# Altium footprint library Footprints.PcbLib: 135 footprints (part 5 of 9)
Each footprint in its own frame and in the unit in brackets; x right, y up, seen from the top. Pads: shape width x height; smd on the part's side, far side on the other; paste and mask are expansions set on the pad; w line width, h text height; cw(c..) or ccw(c..) is an arc to the next point about the centre after c.
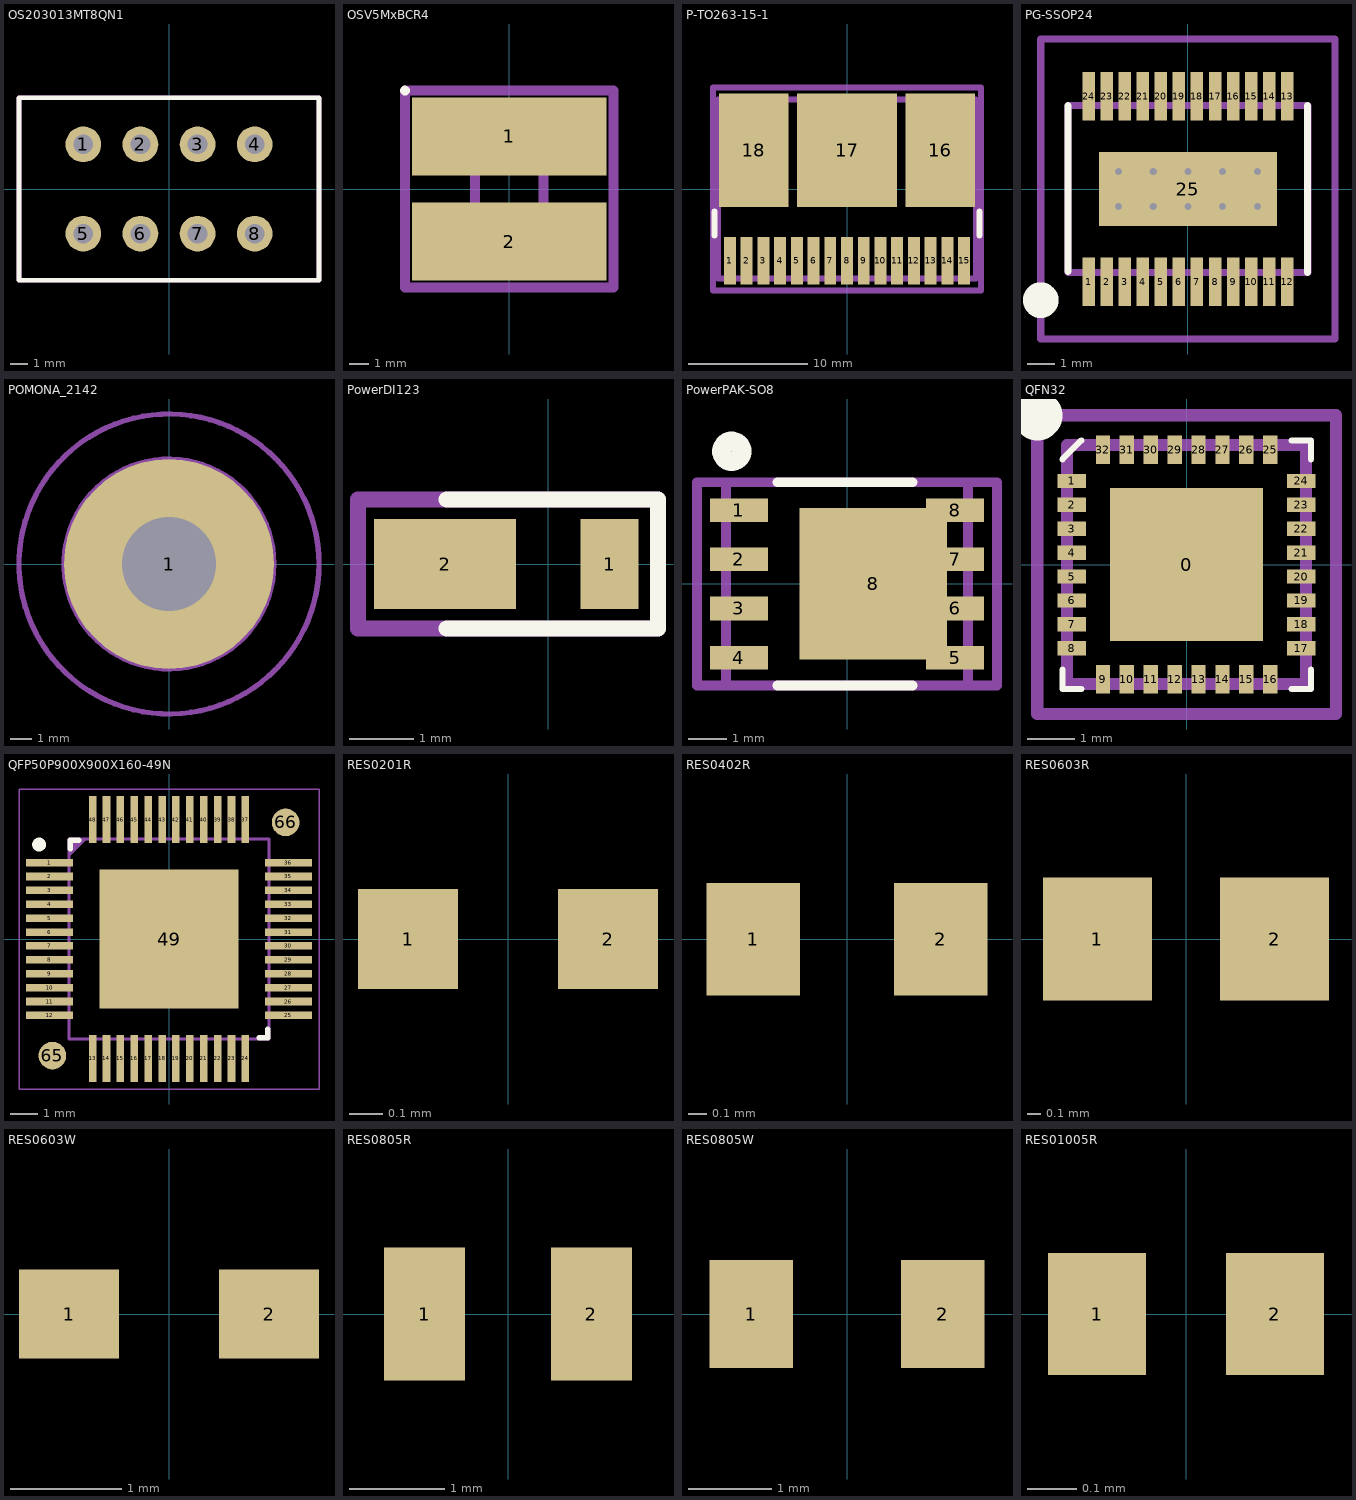
[diagram p4: the footprints below, top view; thin cyan lines are the x and y axes]

## OS203013MT8QN1 [mm] "DP3T Slide Switch"
height 2.88
pads (8):
  round 2 hole 1.1 mask+0.102: 1(-4.8,2.5) 2(-1.6,2.5) 3(1.6,2.5) 4(4.8,2.5) 5(-4.8,-2.5) 6(-1.6,-2.5) 7(1.6,-2.5) 8(4.8,-2.5)
Top Overlay:
  lines w0.254: -8.4,-5.1 8.4,-5.1 8.4,5.1 -8.4,5.1 -8.4,-5.1
Mechanical 13:
  lines w0.254: -8.4,-5.1 8.4,-5.1 8.4,5.1 -8.4,5.1 -8.4,-5.1
Mechanical 15:
  lines w0.254: -8.4,-5.1 8.4,-5.1 8.4,5.1 -8.4,5.1 -8.4,-5.1
3D body: height 10, standoff 0, extent -5.1,-1.8 -2,1.8
3D body: height 7, standoff 0, extent -8.4,-5.1 8.4,5.1
3D body: height 7.1, standoff 1, extent -5.1,-1.8 5.1,1.8

## OSV5MxBCR4 [mm] "High Power Red LED"
height 1.2
pads (2):
  rect 10x4 smd mask+0.102: 1(0,2.7) 2(0,-2.7)
Top Overlay:
  circle w0.254: c-5.35,5.05 r0.125
Mechanical 13:
  lines w0.508: -1.75,-1.75 1.75,-1.75 1.75,1.75 -1.75,1.75 -1.75,-1.75
Mechanical 15:
  lines w0.508: -5.35,-5.05 5.35,-5.05 5.35,5.05 -5.35,5.05 -5.35,-5.05
3D body: height 1.6, standoff -0.05, extent -1.4,-1.775 1.4,1.725

## P-TO263-15-1 [mm]
height 4.4
pads (18):
  rect 1x4 smd mask+0.102: 1(-9.8,-6) 2(-8.4,-6) 3(-7,-6) 4(-5.6,-6) 5(-4.2,-6) 6(-2.8,-6) 7(-1.4,-6) 8(0,-6) 9(1.4,-6) 10(2.8,-6) 11(4.2,-6) 12(5.6,-6) 13(7,-6) 14(8.4,-6) 15(9.8,-6)
  rect 5.8x9.5 smd mask+0.102: 16(7.8,3.25) 18(-7.8,3.25)
  rect 8.4x9.5 smd mask+0.102: 17(0,3.25)
Top Overlay:
  lines w0.508: -11.1,-3.9 -11.1,-1.9 ; 11.1,-3.9 11.1,-1.9
Mechanical 13:
  lines w0.508: -10.8,-7.5 -10.8,7.5 10.8,7.5 10.8,-7.5 -10.6,-7.5 -10.8,-7.5
Mechanical 15:
  lines w0.508: -11.2,-8.5 11.2,-8.5 11.2,8.5 -11.2,8.5 -11.2,-8.5
3D body: height 4.45, standoff 0, extent -10.8,-7.4 10.8,7.6

## PG-SSOP24 [mm]
height 1.7
pads (25):
  rect 0.45x1.75 smd: 1(-3.575,-3.345) 2(-2.925,-3.345) 3(-2.275,-3.345) 4(-1.625,-3.345) 5(-0.975,-3.345) 6(-0.325,-3.345) 7(0.325,-3.345) 8(0.975,-3.345) 9(1.625,-3.345) 10(2.275,-3.345) 11(2.925,-3.345) 12(3.575,-3.345) 13(3.575,3.345) 14(2.925,3.345) 15(2.275,3.345) 16(1.625,3.345) 17(0.975,3.345) 18(0.325,3.345) 19(-0.325,3.345) 20(-0.975,3.345) 21(-1.625,3.345) 22(-2.275,3.345) 23(-2.925,3.345) 24(-3.575,3.345)
  rect 6.4x2.65 smd: 25(0,0)
via -2.5,-0.625 diameter 0.635 hole 0.254
via -1.25,-0.625 diameter 0.635 hole 0.254
via 0,-0.625 diameter 0.635 hole 0.254
via 1.25,-0.625 diameter 0.635 hole 0.254
via 2.5,-0.625 diameter 0.635 hole 0.254
via 2.5,0.625 diameter 0.635 hole 0.254
via 1.25,0.625 diameter 0.635 hole 0.254
via 0,0.625 diameter 0.635 hole 0.254
via -1.25,0.625 diameter 0.635 hole 0.254
via -2.5,0.625 diameter 0.635 hole 0.254
Bottom Layer:
  region: -3.2,1.325 3.2,1.325 3.2,-1.325 -3.2,-1.325
Top Overlay:
  circle w1: c-5.3,-4 r0.141
  lines w0.254: -4.325,-2.975 -4.325,3 ; 4.3,-3 4.3,3
Bottom Solder:
  region: -3.3,1.425 3.3,1.425 3.3,-1.425 -3.3,-1.425
Mechanical 13:
  lines w0.254: -4.325,-3 -4.325,3 4.325,3 4.325,-3 -4.325,-3
Mechanical 15:
  lines w0.254: -5.3,-5.4 5.3,-5.4 5.3,5.4 -5.3,5.4 -5.3,-5.4
3D body: height 1.21, standoff -0.01, extent -3.9,-3.201 3.899,3.201

## POMONA_2142 [mm] "Single"
height 22.35
pads (1):
  round 10 hole 4.5 mask+0.102: 1(0,0)
Mechanical 13:
  circle w0.254: c0,0 r5
Mechanical 15:
  circle w0.254: c0,0 r7.15
3D body: height 21, standoff -9.5, extent -7.25,-7.25 7.25,7.25

## PowerDI123 [mm]
height 1
pads (2):
  rect 0.9x1.4 smd mask+0.102: 1(0.95,0)
  rect 2.2x1.4 smd mask+0.102: 2(-1.6,0)
Top Overlay:
  lines w0.254: -1.575,-1 1.7,-1 1.7,1 -1.575,1
Mechanical 13:
  lines w0.254: 1.675,1 -2.95,1 -2.95,-1 1.7,-1 1.7,1
Mechanical 15:
  lines w0.254: -2.95,-1 -2.95,1 1.7,1 1.7,-1 -2.95,-1
3D body: height 1, standoff 0, extent -2.025,-0.875 0.725,0.875
3D body: height 1.1, standoff 0.1, extent 0.2,-0.85 0.4,0.85
3D body: height 0.2, standoff 0.1, extent 0.725,-0.65 1.15,0.65
3D body: height 0.2, standoff 0.1, extent -2.425,-0.65 -2.025,0.65

## PowerPAK-SO8 [mm]
height 1.04
pads (9):
  rect 1.5x0.61 smd mask+0.102: 1(-2.795,1.905) 2(-2.795,0.635) 3(-2.795,-0.635) 4(-2.795,-1.905) 5(2.795,-1.905) 6(2.795,-0.635) 7(2.795,0.635) 8(2.795,1.905)
  rect 3.81x3.91 smd: 8(0.68,0)
Top Overlay:
  circle w0.5: c-2.975,3.425 r0.257
  lines w0.254: -1.8,-2.625 1.7,-2.625 ; -1.8,2.625 1.7,2.625
Mechanical 13:
  lines w0.254: -3.125,-2.625 -3.125,2.625 3.125,2.625 3.125,-2.625 -3.125,-2.625
Mechanical 15:
  lines w0.254: -3.875,-2.625 -3.875,2.625 3.875,2.625 3.875,-2.625 -3.875,-2.625
3D body: height 1.09, standoff -0.03, extent -3.07,-2.6 3.17,2.65

## QFN32 [mm]
height 0.9
pads (33):
  rect 3.2x3.2 smd paste-3.2: 0(0,0)
  rect 0.6x0.3 smd: 1(-2.4,1.75) 2(-2.4,1.25) 3(-2.4,0.75) 4(-2.4,0.25) 5(-2.4,-0.25) 6(-2.4,-0.75) 7(-2.4,-1.25) 8(-2.4,-1.75) 17(2.4,-1.75) 18(2.4,-1.25) 19(2.4,-0.75) 20(2.4,-0.25) 21(2.4,0.25) 22(2.4,0.75) 23(2.4,1.25) 24(2.4,1.75)
  rect 0.3x0.6 smd: 9(-1.75,-2.4) 10(-1.25,-2.4) 11(-0.75,-2.4) 12(-0.25,-2.4) 13(0.25,-2.4) 14(0.75,-2.4) 15(1.25,-2.4) 16(1.75,-2.4) 25(1.75,2.4) 26(1.25,2.4) 27(0.75,2.4) 28(0.25,2.4) 29(-0.25,2.4) 30(-0.75,2.4) 31(-1.25,2.4) 32(-1.75,2.4)
Top Overlay:
  circle w1: c-3.125,3.125 r0.025
  lines w0.127: -2.6,-2.2 -2.6,-2.6 -2.2,-2.6 ; -2.6,2.2 -2.2,2.6 ; 2.2,-2.6 2.6,-2.6 2.6,-2.2 ; 2.2,2.6 2.6,2.6 2.6,2.2
Top Paste:
  rectangle: -1.3,-1.3 -0.3,-0.3
  rectangle: 0.3,-1.3 1.3,-0.3
  rectangle: 0.3,0.3 1.3,1.3
  rectangle: -1.3,0.3 -0.3,1.3
Mechanical 13:
  lines w0.254: -2.5,-2.5 2.5,-2.5 2.5,2.5 -2.5,2.5 -2.5,-2.5
Mechanical 15:
  lines w0.254: -3.125,-3.125 -3.125,3.125 3.125,3.125 3.125,-3.125 -3.125,-3.125
3D body: height 0.85, standoff 0, extent -2.5,-2.5 2.5,2.5

## QFP50P900X900X160-49N [mm] "A3930 (ALLEGRO JP 48pin LQFP W/Thermal Pad)"
height 1.6
pads (51):
  rect 1.7x0.271 smd mask+0.076: 1(-4.3,2.75) 2(-4.3,2.25) 3(-4.3,1.75) 4(-4.3,1.25) 5(-4.3,0.75) 6(-4.3,0.25) 7(-4.3,-0.25) 8(-4.3,-0.75) 9(-4.3,-1.25) 10(-4.3,-1.75) 11(-4.3,-2.25) 12(-4.3,-2.75) 25(4.3,-2.75) 26(4.3,-2.25) 27(4.3,-1.75) 28(4.3,-1.25) 29(4.3,-0.75) 30(4.3,-0.25) 31(4.3,0.25) 32(4.3,0.75) 33(4.3,1.25) 34(4.3,1.75) 35(4.3,2.25) 36(4.3,2.75)
  rect 0.271x1.7 smd mask+0.076: 13(-2.75,-4.3) 14(-2.25,-4.3) 15(-1.75,-4.3) 16(-1.25,-4.3) 17(-0.75,-4.3) 18(-0.25,-4.3) 19(0.25,-4.3) 20(0.75,-4.3) 21(1.25,-4.3) 22(1.75,-4.3) 23(2.25,-4.3) 24(2.75,-4.3) 37(2.75,4.3) 38(2.25,4.3) 39(1.75,4.3) 40(1.25,4.3) 41(0.75,4.3) 42(0.25,4.3) 43(-0.25,4.3) 44(-0.75,4.3) 45(-1.25,4.3) 46(-1.75,4.3) 47(-2.25,4.3) 48(-2.75,4.3)
  rect 5x5 smd: 49(0,0)
  round 1 smd paste-0.5 mask+0.5: 65(-4.2,-4.2) 66(4.2,4.2)
Top Overlay:
  circle w0.25: c-4.675,3.4 r0.125
  lines w0.2: -3.55,3.25 -3.55,3.55 -3.25,3.55 ; 3.25,-3.55 3.55,-3.55 3.55,-3.25
Mechanical 13:
  lines w0.1: -3.6,3 -3,3.6 ; -3.6,3.1 -3.1,3.6 ; -3.6,3.2 -3.2,3.6 ; -3.6,3.3 -3.3,3.6 ; -3.6,3.4 -3.4,3.6 ; -3.6,3.5 -3.5,3.6 ; -3.6,-3.6 -3.6,3.6 3.6,3.6 3.6,-3.6 -3.6,-3.6
Mechanical 15:
  lines w0.05: -0.5,0 0.5,0 ; 0,-0.5 0,0 0,0.5 ; -5.4,-5.4 -5.4,5.4 5.4,5.4 5.4,-5.4 -5.4,-5.4
3D body: height 1.6, standoff 0.05, extent -3.6,-3.6 3.6,3.6

## RES0201R [mm] "resistor 0201 reflow soldering"
pads (2):
  rect 0.3x0.3 smd paste+0 mask+0.075: 1(-0.3,0) 2(0.3,0)
3D body: height 0.3, standoff 0, extent -0.3,-0.15 0.3,0.15

## RES0402R [mm] "resistor 0402 reflow soldering"
pads (2):
  rect 0.5x0.6 smd: 1(-0.5,0) 2(0.5,0)
3D body: height 0.3, standoff 0, extent -0.5,-0.25 0.5,0.25

## RES0603R [mm] "resistor 0603 reflow soldering"
pads (2):
  rect 0.8x0.9 smd: 1(-0.65,0) 2(0.65,0)
3D body: height 0.45, standoff 0, extent -0.8,-0.4 0.8,0.4

## RES0603W [mm] "resistor 0603 wave soldering"
pads (2):
  rect 0.9x0.8 smd: 1(-0.9,0) 2(0.9,0)
3D body: height 0.45, standoff 0, extent -0.8,-0.4 0.8,0.4

## RES0805R [mm] "resistor 0805 reflow soldering"
pads (2):
  rect 0.85x1.4 smd: 1(-0.875,0) 2(0.875,0)
3D body: height 0.5, standoff 0, extent -1,-0.625 1,0.625

## RES0805W [mm] "resistor 0805 wave soldering"
pads (2):
  rect 1x1.3 smd: 1(-1.15,0) 2(1.15,0)
3D body: height 0.5, standoff 0, extent -1,-0.625 1,0.625

## RES01005R [mm] "resistor 01005 reflow soldering"
pads (2):
  rect 0.2x0.25 smd paste+0 mask+0.05: 1(-0.182,0) 2(0.182,0)
3D body: height 0.13, standoff 0, extent -0.2,-0.1 -0.1,0.1
3D body: height 0.13, standoff 0, extent -0.1,-0.1 0.1,0.1
3D body: height 0.13, standoff 0, extent 0.1,-0.1 0.2,0.1